# Altium schematic symbol library jlcpcb_2025_04_capacitors_extended_0805.schlib: 3281 symbols (part 18 of 18)
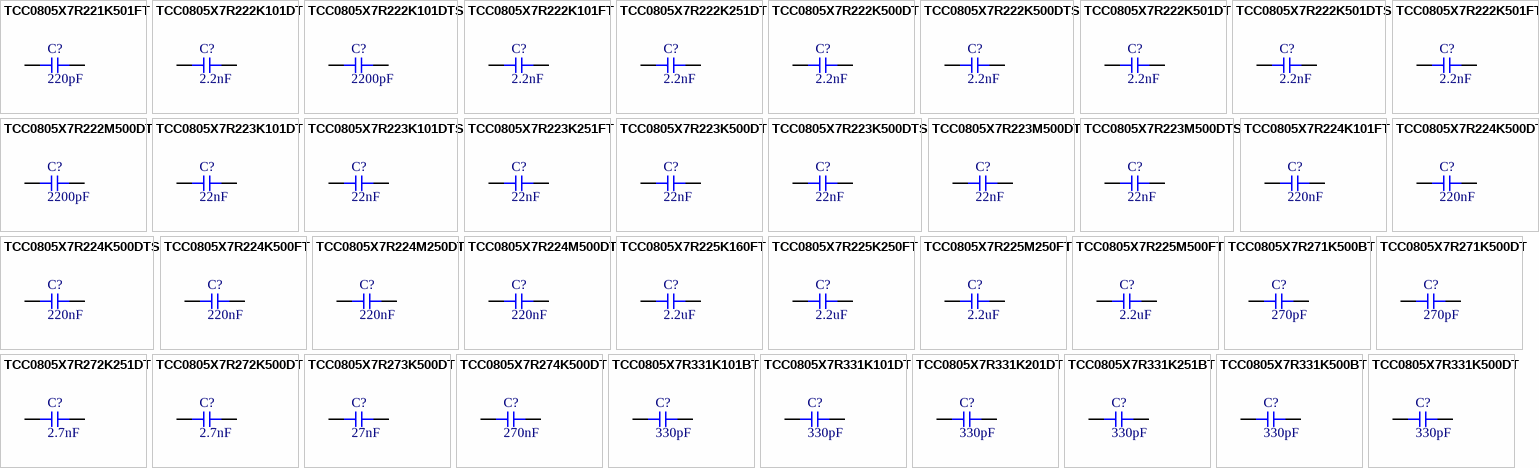
[diagram p99: symbols TCC0805X7R221K501FT to TCC0805X7R331K500DT]

## TCC0805X7R222K500DT
designator C?  Capacitance: 2.2nF  (hidden comment: *)
Capacitor, Ceramic (MLCC), 2.2nF, ±10%, 50V, X7R, ±10%, SMD 0805; Manufacturer: CCTC; Manufacturer Part Number: TCC0805X7R222K500DT; Package Size: 0805; JLCPCB Basic Part: No; JLCPCB Part Number: C376953; Supplier 1: LCSC; Category: Capacitors - MLCC; Supplier Part Number 1: C376953; Tolerance: ±10%; Voltage Rating: 50V; Temperature Coefficient: X7R; RoHS: Yes; ComponentLink1Description: Datasheet; ComponentLink1URL: https://wmsc.lcsc.com/wmsc/upload/file/pdf/v2/lcsc/2304140030_CCTC-TCC0805X7R222K500DT_C376953.pdf; ComponentLink2Description: JLCPCB Part URL; ComponentLink2URL: https://jlcpcb.com/partdetail/C376953; ComponentLink3Description: LCSC Part URL; ComponentLink3URL: https://lcsc.com/product-detail/Multilayer-Ceramic-Capacitors-MLCC---SMD-SMT_CCTC-CCTC-TCC0805X7R222K500DT_C376953.html
footprint CAP-0805 (0805 (2012M) Capacitor)
pins: 1, 2

## TCC0805X7R222K500DTS
designator C?  Capacitance: 2.2nF  (hidden comment: *)
Capacitor, Ceramic (MLCC), 2.2nF, ±10%, 50V, X7R, ±10%, SMD 0805; Manufacturer: CCTC; Manufacturer Part Number: TCC0805X7R222K500DTS; Package Size: 0805; JLCPCB Basic Part: No; JLCPCB Part Number: C376954; Supplier 1: LCSC; Category: Capacitors - MLCC; Supplier Part Number 1: C376954; Tolerance: ±10%; Voltage Rating: 50V; Temperature Coefficient: X7R; RoHS: Yes; ComponentLink1Description: Datasheet; ComponentLink1URL: https://wmsc.lcsc.com/wmsc/upload/file/pdf/v2/lcsc/2304140030_CCTC-TCC0805X7R222K500DTS_C376954.pdf; ComponentLink2Description: JLCPCB Part URL; ComponentLink2URL: https://jlcpcb.com/partdetail/C376954; ComponentLink3Description: LCSC Part URL; ComponentLink3URL: https://lcsc.com/product-detail/Multilayer-Ceramic-Capacitors-MLCC---SMD-SMT_CCTC-CCTC-TCC0805X7R222K500DTS_C376954.html
footprint CAP-0805 (0805 (2012M) Capacitor)
pins: 1, 2

## TCC0805X7R222K501DT
designator C?  Capacitance: 2.2nF  (hidden comment: *)
Capacitor, Ceramic (MLCC), 2.2nF, ±10%, 500V, X7R, ±10%, SMD 0805; Manufacturer: CCTC; Manufacturer Part Number: TCC0805X7R222K501DT; Package Size: 0805; JLCPCB Basic Part: No; JLCPCB Part Number: C376955; Supplier 1: LCSC; Category: Capacitors - MLCC; Supplier Part Number 1: C376955; Tolerance: ±10%; Voltage Rating: 500V; Temperature Coefficient: X7R; RoHS: Yes; ComponentLink1Description: Datasheet; ComponentLink1URL: https://wmsc.lcsc.com/wmsc/upload/file/pdf/v2/lcsc/2304140030_CCTC-TCC0805X7R222K501DT_C376955.pdf; ComponentLink2Description: JLCPCB Part URL; ComponentLink2URL: https://jlcpcb.com/partdetail/C376955; ComponentLink3Description: LCSC Part URL; ComponentLink3URL: https://lcsc.com/product-detail/Multilayer-Ceramic-Capacitors-MLCC---SMD-SMT_CCTC-CCTC-TCC0805X7R222K501DT_C376955.html
footprint CAP-0805 (0805 (2012M) Capacitor)
pins: 1, 2

## TCC0805X7R222K501DTS
designator C?  Capacitance: 2.2nF  (hidden comment: *)
Capacitor, Ceramic (MLCC), 2.2nF, ±10%, 500V, X7R, ±10%, SMD 0805; Manufacturer: CCTC; Manufacturer Part Number: TCC0805X7R222K501DTS; Package Size: 0805; JLCPCB Basic Part: No; JLCPCB Part Number: C696850; Supplier 1: LCSC; Category: Capacitors - MLCC; Supplier Part Number 1: C696850; Tolerance: ±10%; Voltage Rating: 500V; Temperature Coefficient: X7R; RoHS: Yes; ComponentLink1Description: Datasheet; ComponentLink1URL: https://wmsc.lcsc.com/wmsc/upload/file/pdf/v2/lcsc/2304140030_CCTC-TCC0805X7R222K501DTS_C696850.pdf; ComponentLink2Description: JLCPCB Part URL; ComponentLink2URL: https://jlcpcb.com/partdetail/C696850; ComponentLink3Description: LCSC Part URL; ComponentLink3URL: https://lcsc.com/product-detail/Multilayer-Ceramic-Capacitors-MLCC---SMD-SMT_CCTC-CCTC-TCC0805X7R222K501DTS_C696850.html
footprint CAP-0805 (0805 (2012M) Capacitor)
pins: 1, 2

## TCC0805X7R222K501FT
designator C?  Capacitance: 2.2nF  (hidden comment: *)
Capacitor, Ceramic (MLCC), 2.2nF, ±10%, 500V, X7R, ±10%, SMD 0805; Manufacturer: CCTC; Manufacturer Part Number: TCC0805X7R222K501FT; Package Size: 0805; JLCPCB Basic Part: No; JLCPCB Part Number: C376956; Supplier 1: LCSC; Category: Capacitors - MLCC; Supplier Part Number 1: C376956; Tolerance: ±10%; Voltage Rating: 500V; Temperature Coefficient: X7R; RoHS: Yes; ComponentLink1Description: Datasheet; ComponentLink1URL: https://wmsc.lcsc.com/wmsc/upload/file/pdf/v2/lcsc/2304140030_CCTC-TCC0805X7R222K501FT_C376956.pdf; ComponentLink2Description: JLCPCB Part URL; ComponentLink2URL: https://jlcpcb.com/partdetail/C376956; ComponentLink3Description: LCSC Part URL; ComponentLink3URL: https://lcsc.com/product-detail/Multilayer-Ceramic-Capacitors-MLCC---SMD-SMT_CCTC-CCTC-TCC0805X7R222K501FT_C376956.html
footprint CAP-0805 (0805 (2012M) Capacitor)
pins: 1, 2

## TCC0805X7R222M500DT
designator C?  Capacitance: 2200pF  (hidden comment: *)
Capacitor, Ceramic (MLCC), 2200pF, ±20%, 50V, X7R, ±20%, SMD 0805; Manufacturer: CCTC; Manufacturer Part Number: TCC0805X7R222M500DT; Package Size: 0805; JLCPCB Basic Part: No; JLCPCB Part Number: C915856; Supplier 1: LCSC; Category: Capacitors - MLCC; Supplier Part Number 1: C915856; Tolerance: ±20%; Voltage Rating: 50V; Temperature Coefficient: X7R; RoHS: Yes; ComponentLink1Description: Datasheet; ComponentLink1URL: https://wmsc.lcsc.com/wmsc/upload/file/pdf/v2/lcsc/2304140030_CCTC-TCC0805X7R222M500DT_C915856.pdf; ComponentLink2Description: JLCPCB Part URL; ComponentLink2URL: https://jlcpcb.com/partdetail/C915856; ComponentLink3Description: LCSC Part URL; ComponentLink3URL: https://lcsc.com/product-detail/Multilayer-Ceramic-Capacitors-MLCC---SMD-SMT_CCTC-CCTC-TCC0805X7R222M500DT_C915856.html
footprint CAP-0805 (0805 (2012M) Capacitor)
pins: 1, 2

## TCC0805X7R223K101DT
designator C?  Capacitance: 22nF  (hidden comment: *)
Capacitor, Ceramic (MLCC), 22nF, ±10%, 100V, X7R, ±10%, SMD 0805; Manufacturer: CCTC; Manufacturer Part Number: TCC0805X7R223K101DT; Package Size: 0805; JLCPCB Basic Part: No; JLCPCB Part Number: C282749; Supplier 1: LCSC; Category: Capacitors - MLCC; Supplier Part Number 1: C282749; Tolerance: ±10%; Voltage Rating: 100V; Temperature Coefficient: X7R; RoHS: Yes; ComponentLink1Description: Datasheet; ComponentLink1URL: https://wmsc.lcsc.com/wmsc/upload/file/pdf/v2/lcsc/2304140030_CCTC-TCC0805X7R223K101DT_C282749.pdf; ComponentLink2Description: JLCPCB Part URL; ComponentLink2URL: https://jlcpcb.com/partdetail/C282749; ComponentLink3Description: LCSC Part URL; ComponentLink3URL: https://lcsc.com/product-detail/Multilayer-Ceramic-Capacitors-MLCC---SMD-SMT_CCTC-CCTC-TCC0805X7R223K101DT_C282749.html
footprint CAP-0805 (0805 (2012M) Capacitor)
pins: 1, 2

## TCC0805X7R223K101DTS
designator C?  Capacitance: 22nF  (hidden comment: *)
Capacitor, Ceramic (MLCC), 22nF, ±10%, 100V, X7R, ±10%, SMD 0805; Manufacturer: CCTC; Manufacturer Part Number: TCC0805X7R223K101DTS; Package Size: 0805; JLCPCB Basic Part: No; JLCPCB Part Number: C696903; Supplier 1: LCSC; Category: Capacitors - MLCC; Supplier Part Number 1: C696903; Tolerance: ±10%; Voltage Rating: 100V; Temperature Coefficient: X7R; RoHS: Yes; ComponentLink1Description: Datasheet; ComponentLink1URL: https://wmsc.lcsc.com/wmsc/upload/file/pdf/v2/lcsc/2007071712_CCTC-TCC0805X7R223K101DTS_C696903.pdf; ComponentLink2Description: JLCPCB Part URL; ComponentLink2URL: https://jlcpcb.com/partdetail/C696903; ComponentLink3Description: LCSC Part URL; ComponentLink3URL: https://lcsc.com/product-detail/Multilayer-Ceramic-Capacitors-MLCC---SMD-SMT_CCTC-CCTC-TCC0805X7R223K101DTS_C696903.html
footprint CAP-0805 (0805 (2012M) Capacitor)
pins: 1, 2

## TCC0805X7R223K251FT
designator C?  Capacitance: 22nF  (hidden comment: *)
Capacitor, Ceramic (MLCC), 22nF, ±10%, 250V, X7R, ±10%, SMD 0805; Manufacturer: CCTC; Manufacturer Part Number: TCC0805X7R223K251FT; Package Size: 0805; JLCPCB Basic Part: No; JLCPCB Part Number: C282751; Supplier 1: LCSC; Category: Capacitors - MLCC; Supplier Part Number 1: C282751; Tolerance: ±10%; Voltage Rating: 250V; Temperature Coefficient: X7R; RoHS: Yes; ComponentLink1Description: Datasheet; ComponentLink1URL: https://wmsc.lcsc.com/wmsc/upload/file/pdf/v2/lcsc/2304140030_CCTC-TCC0805X7R223K251FT_C282751.pdf; ComponentLink2Description: JLCPCB Part URL; ComponentLink2URL: https://jlcpcb.com/partdetail/C282751; ComponentLink3Description: LCSC Part URL; ComponentLink3URL: https://lcsc.com/product-detail/Multilayer-Ceramic-Capacitors-MLCC---SMD-SMT_CCTC-CCTC-TCC0805X7R223K251FT_C282751.html
footprint CAP-0805 (0805 (2012M) Capacitor)
pins: 1, 2

## TCC0805X7R223K500DT
designator C?  Capacitance: 22nF  (hidden comment: *)
Capacitor, Ceramic (MLCC), 22nF, ±10%, 50V, X7R, ±10%, SMD 0805; Manufacturer: CCTC; Manufacturer Part Number: TCC0805X7R223K500DT; Package Size: 0805; JLCPCB Basic Part: No; JLCPCB Part Number: C282752; Supplier 1: LCSC; Category: Capacitors - MLCC; Supplier Part Number 1: C282752; Tolerance: ±10%; Voltage Rating: 50V; Temperature Coefficient: X7R; RoHS: Yes; ComponentLink1Description: Datasheet; ComponentLink1URL: https://wmsc.lcsc.com/wmsc/upload/file/pdf/v2/lcsc/2304140030_CCTC-TCC0805X7R223K500DT_C282752.pdf; ComponentLink2Description: JLCPCB Part URL; ComponentLink2URL: https://jlcpcb.com/partdetail/C282752; ComponentLink3Description: LCSC Part URL; ComponentLink3URL: https://lcsc.com/product-detail/Multilayer-Ceramic-Capacitors-MLCC---SMD-SMT_CCTC-CCTC-TCC0805X7R223K500DT_C282752.html
footprint CAP-0805 (0805 (2012M) Capacitor)
pins: 1, 2

## TCC0805X7R223K500DTS
designator C?  Capacitance: 22nF  (hidden comment: *)
Capacitor, Ceramic (MLCC), 22nF, ±10%, 50V, X7R, ±10%, SMD 0805; Manufacturer: CCTC; Manufacturer Part Number: TCC0805X7R223K500DTS; Package Size: 0805; JLCPCB Basic Part: No; JLCPCB Part Number: C376957; Supplier 1: LCSC; Category: Capacitors - MLCC; Supplier Part Number 1: C376957; Tolerance: ±10%; Voltage Rating: 50V; Temperature Coefficient: X7R; RoHS: Yes; ComponentLink1Description: Datasheet; ComponentLink1URL: https://wmsc.lcsc.com/wmsc/upload/file/pdf/v2/lcsc/2304140030_CCTC-TCC0805X7R223K500DTS_C376957.pdf; ComponentLink2Description: JLCPCB Part URL; ComponentLink2URL: https://jlcpcb.com/partdetail/C376957; ComponentLink3Description: LCSC Part URL; ComponentLink3URL: https://lcsc.com/product-detail/Multilayer-Ceramic-Capacitors-MLCC---SMD-SMT_CCTC-CCTC-TCC0805X7R223K500DTS_C376957.html
footprint CAP-0805 (0805 (2012M) Capacitor)
pins: 1, 2

## TCC0805X7R223M500DT
designator C?  Capacitance: 22nF  (hidden comment: *)
Capacitor, Ceramic (MLCC), 22nF, ±20%, 50V, X7R, ±20%, SMD 0805; Manufacturer: CCTC; Manufacturer Part Number: TCC0805X7R223M500DT; Package Size: 0805; JLCPCB Basic Part: No; JLCPCB Part Number: C376958; Supplier 1: LCSC; Category: Capacitors - MLCC; Supplier Part Number 1: C376958; Tolerance: ±20%; Voltage Rating: 50V; Temperature Coefficient: X7R; RoHS: Yes; ComponentLink1Description: Datasheet; ComponentLink1URL: https://wmsc.lcsc.com/wmsc/upload/file/pdf/v2/lcsc/2304140030_CCTC-TCC0805X7R223M500DT_C376958.pdf; ComponentLink2Description: JLCPCB Part URL; ComponentLink2URL: https://jlcpcb.com/partdetail/C376958; ComponentLink3Description: LCSC Part URL; ComponentLink3URL: https://lcsc.com/product-detail/Multilayer-Ceramic-Capacitors-MLCC---SMD-SMT_CCTC-CCTC-TCC0805X7R223M500DT_C376958.html
footprint CAP-0805 (0805 (2012M) Capacitor)
pins: 1, 2

## TCC0805X7R223M500DTS
designator C?  Capacitance: 22nF  (hidden comment: *)
Capacitor, Ceramic (MLCC), 22nF, ±20%, 50V, X7R, ±20%, SMD 0805; Manufacturer: CCTC; Manufacturer Part Number: TCC0805X7R223M500DTS; Package Size: 0805; JLCPCB Basic Part: No; JLCPCB Part Number: C376959; Supplier 1: LCSC; Category: Capacitors - MLCC; Supplier Part Number 1: C376959; Tolerance: ±20%; Voltage Rating: 50V; Temperature Coefficient: X7R; RoHS: Yes; ComponentLink1Description: Datasheet; ComponentLink1URL: https://wmsc.lcsc.com/wmsc/upload/file/pdf/v2/lcsc/2304140030_CCTC-TCC0805X7R223M500DTS_C376959.pdf; ComponentLink2Description: JLCPCB Part URL; ComponentLink2URL: https://jlcpcb.com/partdetail/C376959; ComponentLink3Description: LCSC Part URL; ComponentLink3URL: https://lcsc.com/product-detail/Multilayer-Ceramic-Capacitors-MLCC---SMD-SMT_CCTC-CCTC-TCC0805X7R223M500DTS_C376959.html
footprint CAP-0805 (0805 (2012M) Capacitor)
pins: 1, 2

## TCC0805X7R224K101FT
designator C?  Capacitance: 220nF  (hidden comment: *)
Capacitor, Ceramic (MLCC), 220nF, ±10%, 100V, X7R, ±10%, SMD 0805; Manufacturer: CCTC; Manufacturer Part Number: TCC0805X7R224K101FT; Package Size: 0805; JLCPCB Basic Part: No; JLCPCB Part Number: C2994652; Supplier 1: LCSC; Category: Capacitors - MLCC; Supplier Part Number 1: C2994652; Tolerance: ±10%; Voltage Rating: 100V; Temperature Coefficient: X7R; RoHS: Yes; ComponentLink1Description: Datasheet; ComponentLink1URL: https://wmsc.lcsc.com/wmsc/upload/file/pdf/v2/lcsc/2204121745_CCTC-TCC0805X7R224K101FT_C2994652.pdf; ComponentLink2Description: JLCPCB Part URL; ComponentLink2URL: https://jlcpcb.com/partdetail/C2994652; ComponentLink3Description: LCSC Part URL; ComponentLink3URL: https://lcsc.com/product-detail/Multilayer-Ceramic-Capacitors-MLCC---SMD-SMT_CCTC-CCTC-TCC0805X7R224K101FT_C2994652.html
footprint CAP-0805 (0805 (2012M) Capacitor)
pins: 1, 2

## TCC0805X7R224K500DT
designator C?  Capacitance: 220nF  (hidden comment: *)
Capacitor, Ceramic (MLCC), 220nF, ±10%, 50V, X7R, ±10%, SMD 0805; Manufacturer: CCTC; Manufacturer Part Number: TCC0805X7R224K500DT; Package Size: 0805; JLCPCB Basic Part: No; JLCPCB Part Number: C282753; Supplier 1: LCSC; Category: Capacitors - MLCC; Supplier Part Number 1: C282753; Tolerance: ±10%; Voltage Rating: 50V; Temperature Coefficient: X7R; RoHS: Yes; ComponentLink1Description: Datasheet; ComponentLink1URL: https://wmsc.lcsc.com/wmsc/upload/file/pdf/v2/lcsc/2304140030_CCTC-TCC0805X7R224K500DT_C282753.pdf; ComponentLink2Description: JLCPCB Part URL; ComponentLink2URL: https://jlcpcb.com/partdetail/C282753; ComponentLink3Description: LCSC Part URL; ComponentLink3URL: https://lcsc.com/product-detail/Multilayer-Ceramic-Capacitors-MLCC---SMD-SMT_CCTC-CCTC-TCC0805X7R224K500DT_C282753.html
footprint CAP-0805 (0805 (2012M) Capacitor)
pins: 1, 2

## TCC0805X7R224K500DTS
designator C?  Capacitance: 220nF  (hidden comment: *)
Capacitor, Ceramic (MLCC), 220nF, ±10%, 50V, X7R, ±10%, SMD 0805; Manufacturer: CCTC; Manufacturer Part Number: TCC0805X7R224K500DTS; Package Size: 0805; JLCPCB Basic Part: No; JLCPCB Part Number: C376960; Supplier 1: LCSC; Category: Capacitors - MLCC; Supplier Part Number 1: C376960; Tolerance: ±10%; Voltage Rating: 50V; Temperature Coefficient: X7R; RoHS: Yes; ComponentLink1Description: Datasheet; ComponentLink1URL: https://wmsc.lcsc.com/wmsc/upload/file/pdf/v2/lcsc/2304140030_CCTC-TCC0805X7R224K500DTS_C376960.pdf; ComponentLink2Description: JLCPCB Part URL; ComponentLink2URL: https://jlcpcb.com/partdetail/C376960; ComponentLink3Description: LCSC Part URL; ComponentLink3URL: https://lcsc.com/product-detail/Multilayer-Ceramic-Capacitors-MLCC---SMD-SMT_CCTC-CCTC-TCC0805X7R224K500DTS_C376960.html
footprint CAP-0805 (0805 (2012M) Capacitor)
pins: 1, 2

## TCC0805X7R224K500FT
designator C?  Capacitance: 220nF  (hidden comment: *)
Capacitor, Ceramic (MLCC), 220nF, ±10%, 50V, X7R, ±10%, SMD 0805; Manufacturer: CCTC; Manufacturer Part Number: TCC0805X7R224K500FT; Package Size: 0805; JLCPCB Basic Part: No; JLCPCB Part Number: C376961; Supplier 1: LCSC; Category: Capacitors - MLCC; Supplier Part Number 1: C376961; Tolerance: ±10%; Voltage Rating: 50V; Temperature Coefficient: X7R; RoHS: Yes; ComponentLink1Description: Datasheet; ComponentLink1URL: https://wmsc.lcsc.com/wmsc/upload/file/pdf/v2/lcsc/2304140030_CCTC-TCC0805X7R224K500FT_C376961.pdf; ComponentLink2Description: JLCPCB Part URL; ComponentLink2URL: https://jlcpcb.com/partdetail/C376961; ComponentLink3Description: LCSC Part URL; ComponentLink3URL: https://lcsc.com/product-detail/Multilayer-Ceramic-Capacitors-MLCC---SMD-SMT_CCTC-CCTC-TCC0805X7R224K500FT_C376961.html
footprint CAP-0805 (0805 (2012M) Capacitor)
pins: 1, 2

## TCC0805X7R224M250DT
designator C?  Capacitance: 220nF  (hidden comment: *)
Capacitor, Ceramic (MLCC), 220nF, ±20%, 25V, X7R, ±20%, SMD 0805; Manufacturer: CCTC; Manufacturer Part Number: TCC0805X7R224M250DT; Package Size: 0805; JLCPCB Basic Part: No; JLCPCB Part Number: C376962; Supplier 1: LCSC; Category: Capacitors - MLCC; Supplier Part Number 1: C376962; Tolerance: ±20%; Voltage Rating: 25V; Temperature Coefficient: X7R; RoHS: Yes; ComponentLink1Description: Datasheet; ComponentLink1URL: https://wmsc.lcsc.com/wmsc/upload/file/pdf/v2/lcsc/2304140030_CCTC-TCC0805X7R224M250DT_C376962.pdf; ComponentLink2Description: JLCPCB Part URL; ComponentLink2URL: https://jlcpcb.com/partdetail/C376962; ComponentLink3Description: LCSC Part URL; ComponentLink3URL: https://lcsc.com/product-detail/Multilayer-Ceramic-Capacitors-MLCC---SMD-SMT_CCTC-CCTC-TCC0805X7R224M250DT_C376962.html
footprint CAP-0805 (0805 (2012M) Capacitor)
pins: 1, 2

## TCC0805X7R224M500DT
designator C?  Capacitance: 220nF  (hidden comment: *)
Capacitor, Ceramic (MLCC), 220nF, ±20%, 50V, X7R, ±20%, SMD 0805; Manufacturer: CCTC; Manufacturer Part Number: TCC0805X7R224M500DT; Package Size: 0805; JLCPCB Basic Part: No; JLCPCB Part Number: C2760544; Supplier 1: LCSC; Category: Capacitors - MLCC; Supplier Part Number 1: C2760544; Tolerance: ±20%; Voltage Rating: 50V; Temperature Coefficient: X7R; RoHS: Yes; ComponentLink1Description: Datasheet; ComponentLink1URL: https://wmsc.lcsc.com/wmsc/upload/file/pdf/v2/lcsc/2304140030_CCTC-TCC0805X7R224M500DT_C2760544.pdf; ComponentLink2Description: JLCPCB Part URL; ComponentLink2URL: https://jlcpcb.com/partdetail/C2760544; ComponentLink3Description: LCSC Part URL; ComponentLink3URL: https://lcsc.com/product-detail/Multilayer-Ceramic-Capacitors-MLCC---SMD-SMT_CCTC-CCTC-TCC0805X7R224M500DT_C2760544.html
footprint CAP-0805 (0805 (2012M) Capacitor)
pins: 1, 2

## TCC0805X7R225K160FT
designator C?  Capacitance: 2.2uF  (hidden comment: *)
Capacitor, Ceramic (MLCC), 2.2uF, ±10%, 16V, X7R, ±10%, SMD 0805; Manufacturer: CCTC; Manufacturer Part Number: TCC0805X7R225K160FT; Package Size: 0805; JLCPCB Basic Part: No; JLCPCB Part Number: C380348; Supplier 1: LCSC; Category: Capacitors - MLCC; Supplier Part Number 1: C380348; Tolerance: ±10%; Voltage Rating: 16V; Temperature Coefficient: X7R; RoHS: Yes; ComponentLink1Description: Datasheet; ComponentLink1URL: https://wmsc.lcsc.com/wmsc/upload/file/pdf/v2/lcsc/2304140030_CCTC-TCC0805X7R225K160FT_C380348.pdf; ComponentLink2Description: JLCPCB Part URL; ComponentLink2URL: https://jlcpcb.com/partdetail/C380348; ComponentLink3Description: LCSC Part URL; ComponentLink3URL: https://lcsc.com/product-detail/Multilayer-Ceramic-Capacitors-MLCC---SMD-SMT_CCTC-CCTC-TCC0805X7R225K160FT_C380348.html
footprint CAP-0805 (0805 (2012M) Capacitor)
pins: 1, 2

## TCC0805X7R225K250FT
designator C?  Capacitance: 2.2uF  (hidden comment: *)
Capacitor, Ceramic (MLCC), 2.2uF, ±10%, 25V, X7R, ±10%, SMD 0805; Manufacturer: CCTC; Manufacturer Part Number: TCC0805X7R225K250FT; Package Size: 0805; JLCPCB Basic Part: No; JLCPCB Part Number: C380349; Supplier 1: LCSC; Category: Capacitors - MLCC; Supplier Part Number 1: C380349; Tolerance: ±10%; Voltage Rating: 25V; Temperature Coefficient: X7R; RoHS: Yes; ComponentLink1Description: Datasheet; ComponentLink1URL: https://wmsc.lcsc.com/wmsc/upload/file/pdf/v2/lcsc/2304140030_CCTC-TCC0805X7R225K250FT_C380349.pdf; ComponentLink2Description: JLCPCB Part URL; ComponentLink2URL: https://jlcpcb.com/partdetail/C380349; ComponentLink3Description: LCSC Part URL; ComponentLink3URL: https://lcsc.com/product-detail/Multilayer-Ceramic-Capacitors-MLCC---SMD-SMT_CCTC-CCTC-TCC0805X7R225K250FT_C380349.html
footprint CAP-0805 (0805 (2012M) Capacitor)
pins: 1, 2

## TCC0805X7R225M250FT
designator C?  Capacitance: 2.2uF  (hidden comment: *)
Capacitor, Ceramic (MLCC), 2.2uF, ±20%, 25V, X7R, ±20%, SMD 0805; Manufacturer: CCTC; Manufacturer Part Number: TCC0805X7R225M250FT; Package Size: 0805; JLCPCB Basic Part: No; JLCPCB Part Number: C5448893; Supplier 1: LCSC; Category: Capacitors - MLCC; Supplier Part Number 1: C5448893; Tolerance: ±20%; Voltage Rating: 25V; Temperature Coefficient: X7R; RoHS: Yes; ComponentLink1Description: Datasheet; ComponentLink2Description: JLCPCB Part URL; ComponentLink2URL: https://jlcpcb.com/partdetail/C5448893; ComponentLink3Description: LCSC Part URL; ComponentLink3URL: https://lcsc.com/product-detail/Multilayer-Ceramic-Capacitors-MLCC---SMD-SMT_CCTC-CCTC-TCC0805X7R225M250FT_C5448893.html
footprint CAP-0805 (0805 (2012M) Capacitor)
pins: 1, 2

## TCC0805X7R225M500FT
designator C?  Capacitance: 2.2uF  (hidden comment: *)
Capacitor, Ceramic (MLCC), 2.2uF, ±20%, null, X7R, ±20%, SMD 0805; Manufacturer: CCTC; Manufacturer Part Number: TCC0805X7R225M500FT; Package Size: 0805; JLCPCB Basic Part: No; JLCPCB Part Number: C7393943; Supplier 1: LCSC; Category: Capacitors - MLCC; Supplier Part Number 1: C7393943; Tolerance: ±20%; Voltage Rating: null; Temperature Coefficient: X7R; RoHS: Yes; ComponentLink1Description: Datasheet; ComponentLink1URL: https://wmsc.lcsc.com/wmsc/upload/file/pdf/v2/lcsc/2306211555_CCTC-TCC0805X7R225M500FT_C7393943.pdf; ComponentLink2Description: JLCPCB Part URL; ComponentLink2URL: https://jlcpcb.com/partdetail/C7393943; ComponentLink3Description: LCSC Part URL; ComponentLink3URL: https://lcsc.com/product-detail/Multilayer-Ceramic-Capacitors-MLCC---SMD-SMT_CCTC-CCTC-TCC0805X7R225M500FT_C7393943.html
footprint CAP-0805 (0805 (2012M) Capacitor)
pins: 1, 2

## TCC0805X7R271K500BT
designator C?  Capacitance: 270pF  (hidden comment: *)
Capacitor, Ceramic (MLCC), 270pF, ±10%, 50V, X7R, ±10%, SMD 0805; Manufacturer: CCTC; Manufacturer Part Number: TCC0805X7R271K500BT; Package Size: 0805; JLCPCB Basic Part: No; JLCPCB Part Number: C376964; Supplier 1: LCSC; Category: Capacitors - MLCC; Supplier Part Number 1: C376964; Tolerance: ±10%; Voltage Rating: 50V; Temperature Coefficient: X7R; RoHS: Yes; ComponentLink1Description: Datasheet; ComponentLink1URL: https://wmsc.lcsc.com/wmsc/upload/file/pdf/v2/lcsc/2304140030_CCTC-TCC0805X7R271K500BT_C376964.pdf; ComponentLink2Description: JLCPCB Part URL; ComponentLink2URL: https://jlcpcb.com/partdetail/C376964; ComponentLink3Description: LCSC Part URL; ComponentLink3URL: https://lcsc.com/product-detail/Multilayer-Ceramic-Capacitors-MLCC---SMD-SMT_CCTC-CCTC-TCC0805X7R271K500BT_C376964.html
footprint CAP-0805 (0805 (2012M) Capacitor)
pins: 1, 2

## TCC0805X7R271K500DT
designator C?  Capacitance: 270pF  (hidden comment: *)
Capacitor, Ceramic (MLCC), 270pF, ±10%, 50V, X7R, ±10%, SMD 0805; Manufacturer: CCTC; Manufacturer Part Number: TCC0805X7R271K500DT; Package Size: 0805; JLCPCB Basic Part: No; JLCPCB Part Number: C376965; Supplier 1: LCSC; Category: Capacitors - MLCC; Supplier Part Number 1: C376965; Tolerance: ±10%; Voltage Rating: 50V; Temperature Coefficient: X7R; RoHS: Yes; ComponentLink1Description: Datasheet; ComponentLink1URL: https://wmsc.lcsc.com/wmsc/upload/file/pdf/v2/lcsc/2304140030_CCTC-TCC0805X7R271K500DT_C376965.pdf; ComponentLink2Description: JLCPCB Part URL; ComponentLink2URL: https://jlcpcb.com/partdetail/C376965; ComponentLink3Description: LCSC Part URL; ComponentLink3URL: https://lcsc.com/product-detail/Multilayer-Ceramic-Capacitors-MLCC---SMD-SMT_CCTC-CCTC-TCC0805X7R271K500DT_C376965.html
footprint CAP-0805 (0805 (2012M) Capacitor)
pins: 1, 2

## TCC0805X7R272K251DT
designator C?  Capacitance: 2.7nF  (hidden comment: *)
Capacitor, Ceramic (MLCC), 2.7nF, ±10%, 250V, X7R, ±10%, SMD 0805; Manufacturer: CCTC; Manufacturer Part Number: TCC0805X7R272K251DT; Package Size: 0805; JLCPCB Basic Part: No; JLCPCB Part Number: C5375887; Supplier 1: LCSC; Category: Capacitors - MLCC; Supplier Part Number 1: C5375887; Tolerance: ±10%; Voltage Rating: 250V; Temperature Coefficient: X7R; RoHS: Yes; ComponentLink1Description: Datasheet; ComponentLink1URL: https://wmsc.lcsc.com/wmsc/upload/file/pdf/v2/lcsc/2403281709_CCTC-TCC0805X7R272K251DT_C5375887.pdf; ComponentLink2Description: JLCPCB Part URL; ComponentLink2URL: https://jlcpcb.com/partdetail/C5375887; ComponentLink3Description: LCSC Part URL; ComponentLink3URL: https://lcsc.com/product-detail/Multilayer-Ceramic-Capacitors-MLCC---SMD-SMT_CCTC-CCTC-TCC0805X7R272K251DT_C5375887.html
footprint CAP-0805 (0805 (2012M) Capacitor)
pins: 1, 2

## TCC0805X7R272K500DT
designator C?  Capacitance: 2.7nF  (hidden comment: *)
Capacitor, Ceramic (MLCC), 2.7nF, ±10%, 50V, X7R, ±10%, SMD 0805; Manufacturer: CCTC; Manufacturer Part Number: TCC0805X7R272K500DT; Package Size: 0805; JLCPCB Basic Part: No; JLCPCB Part Number: C376966; Supplier 1: LCSC; Category: Capacitors - MLCC; Supplier Part Number 1: C376966; Tolerance: ±10%; Voltage Rating: 50V; Temperature Coefficient: X7R; RoHS: Yes; ComponentLink1Description: Datasheet; ComponentLink1URL: https://wmsc.lcsc.com/wmsc/upload/file/pdf/v2/lcsc/2304140030_CCTC-TCC0805X7R272K500DT_C376966.pdf; ComponentLink2Description: JLCPCB Part URL; ComponentLink2URL: https://jlcpcb.com/partdetail/C376966; ComponentLink3Description: LCSC Part URL; ComponentLink3URL: https://lcsc.com/product-detail/Multilayer-Ceramic-Capacitors-MLCC---SMD-SMT_CCTC-CCTC-TCC0805X7R272K500DT_C376966.html
footprint CAP-0805 (0805 (2012M) Capacitor)
pins: 1, 2

## TCC0805X7R273K500DT
designator C?  Capacitance: 27nF  (hidden comment: *)
Capacitor, Ceramic (MLCC), 27nF, ±10%, 50V, X7R, ±10%, SMD 0805; Manufacturer: CCTC; Manufacturer Part Number: TCC0805X7R273K500DT; Package Size: 0805; JLCPCB Basic Part: No; JLCPCB Part Number: C376967; Supplier 1: LCSC; Category: Capacitors - MLCC; Supplier Part Number 1: C376967; Tolerance: ±10%; Voltage Rating: 50V; Temperature Coefficient: X7R; RoHS: Yes; ComponentLink1Description: Datasheet; ComponentLink1URL: https://wmsc.lcsc.com/wmsc/upload/file/pdf/v2/lcsc/2304140030_CCTC-TCC0805X7R273K500DT_C376967.pdf; ComponentLink2Description: JLCPCB Part URL; ComponentLink2URL: https://jlcpcb.com/partdetail/C376967; ComponentLink3Description: LCSC Part URL; ComponentLink3URL: https://lcsc.com/product-detail/Multilayer-Ceramic-Capacitors-MLCC---SMD-SMT_CCTC-CCTC-TCC0805X7R273K500DT_C376967.html
footprint CAP-0805 (0805 (2012M) Capacitor)
pins: 1, 2

## TCC0805X7R274K500DT
designator C?  Capacitance: 270nF  (hidden comment: *)
Capacitor, Ceramic (MLCC), 270nF, ±10%, 50V, X7R, ±10%, SMD 0805; Manufacturer: CCTC; Manufacturer Part Number: TCC0805X7R274K500DT; Package Size: 0805; JLCPCB Basic Part: No; JLCPCB Part Number: C376968; Supplier 1: LCSC; Category: Capacitors - MLCC; Supplier Part Number 1: C376968; Tolerance: ±10%; Voltage Rating: 50V; Temperature Coefficient: X7R; RoHS: Yes; ComponentLink1Description: Datasheet; ComponentLink1URL: https://wmsc.lcsc.com/wmsc/upload/file/pdf/v2/lcsc/2304140030_CCTC-TCC0805X7R274K500DT_C376968.pdf; ComponentLink2Description: JLCPCB Part URL; ComponentLink2URL: https://jlcpcb.com/partdetail/C376968; ComponentLink3Description: LCSC Part URL; ComponentLink3URL: https://lcsc.com/product-detail/Multilayer-Ceramic-Capacitors-MLCC---SMD-SMT_CCTC-CCTC-TCC0805X7R274K500DT_C376968.html
footprint CAP-0805 (0805 (2012M) Capacitor)
pins: 1, 2

## TCC0805X7R331K101BT
designator C?  Capacitance: 330pF  (hidden comment: *)
Capacitor, Ceramic (MLCC), 330pF, ±10%, 100V, X7R, ±10%, SMD 0805; Manufacturer: CCTC; Manufacturer Part Number: TCC0805X7R331K101BT; Package Size: 0805; JLCPCB Basic Part: No; JLCPCB Part Number: C376971; Supplier 1: LCSC; Category: Capacitors - MLCC; Supplier Part Number 1: C376971; Tolerance: ±10%; Voltage Rating: 100V; Temperature Coefficient: X7R; RoHS: Yes; ComponentLink1Description: Datasheet; ComponentLink1URL: https://wmsc.lcsc.com/wmsc/upload/file/pdf/v2/lcsc/2304140030_CCTC-TCC0805X7R331K101BT_C376971.pdf; ComponentLink2Description: JLCPCB Part URL; ComponentLink2URL: https://jlcpcb.com/partdetail/C376971; ComponentLink3Description: LCSC Part URL; ComponentLink3URL: https://lcsc.com/product-detail/Multilayer-Ceramic-Capacitors-MLCC---SMD-SMT_CCTC-CCTC-TCC0805X7R331K101BT_C376971.html
footprint CAP-0805 (0805 (2012M) Capacitor)
pins: 1, 2

## TCC0805X7R331K101DT
designator C?  Capacitance: 330pF  (hidden comment: *)
Capacitor, Ceramic (MLCC), 330pF, ±10%, 100V, X7R, ±10%, SMD 0805; Manufacturer: CCTC; Manufacturer Part Number: TCC0805X7R331K101DT; Package Size: 0805; JLCPCB Basic Part: No; JLCPCB Part Number: C344181; Supplier 1: LCSC; Category: Capacitors - MLCC; Supplier Part Number 1: C344181; Tolerance: ±10%; Voltage Rating: 100V; Temperature Coefficient: X7R; RoHS: Yes; ComponentLink1Description: Datasheet; ComponentLink1URL: https://wmsc.lcsc.com/wmsc/upload/file/pdf/v2/lcsc/2304140030_CCTC-TCC0805X7R331K101DT_C344181.pdf; ComponentLink2Description: JLCPCB Part URL; ComponentLink2URL: https://jlcpcb.com/partdetail/C344181; ComponentLink3Description: LCSC Part URL; ComponentLink3URL: https://lcsc.com/product-detail/Multilayer-Ceramic-Capacitors-MLCC---SMD-SMT_CCTC-CCTC-TCC0805X7R331K101DT_C344181.html
footprint CAP-0805 (0805 (2012M) Capacitor)
pins: 1, 2

## TCC0805X7R331K201DT
designator C?  Capacitance: 330pF  (hidden comment: *)
Capacitor, Ceramic (MLCC), 330pF, ±10%, 200V, X7R, ±10%, SMD 0805; Manufacturer: CCTC; Manufacturer Part Number: TCC0805X7R331K201DT; Package Size: 0805; JLCPCB Basic Part: No; JLCPCB Part Number: C344182; Supplier 1: LCSC; Category: Capacitors - MLCC; Supplier Part Number 1: C344182; Tolerance: ±10%; Voltage Rating: 200V; Temperature Coefficient: X7R; RoHS: Yes; ComponentLink1Description: Datasheet; ComponentLink1URL: https://wmsc.lcsc.com/wmsc/upload/file/pdf/v2/lcsc/2304140030_CCTC-TCC0805X7R331K201DT_C344182.pdf; ComponentLink2Description: JLCPCB Part URL; ComponentLink2URL: https://jlcpcb.com/partdetail/C344182; ComponentLink3Description: LCSC Part URL; ComponentLink3URL: https://lcsc.com/product-detail/Multilayer-Ceramic-Capacitors-MLCC---SMD-SMT_CCTC-CCTC-TCC0805X7R331K201DT_C344182.html
footprint CAP-0805 (0805 (2012M) Capacitor)
pins: 1, 2

## TCC0805X7R331K251BT
designator C?  Capacitance: 330pF  (hidden comment: *)
Capacitor, Ceramic (MLCC), 330pF, ±10%, 250V, X7R, ±10%, SMD 0805; Manufacturer: CCTC; Manufacturer Part Number: TCC0805X7R331K251BT; Package Size: 0805; JLCPCB Basic Part: No; JLCPCB Part Number: C376972; Supplier 1: LCSC; Category: Capacitors - MLCC; Supplier Part Number 1: C376972; Tolerance: ±10%; Voltage Rating: 250V; Temperature Coefficient: X7R; RoHS: Yes; ComponentLink1Description: Datasheet; ComponentLink1URL: https://wmsc.lcsc.com/wmsc/upload/file/pdf/v2/lcsc/2304140030_CCTC-TCC0805X7R331K251BT_C376972.pdf; ComponentLink2Description: JLCPCB Part URL; ComponentLink2URL: https://jlcpcb.com/partdetail/C376972; ComponentLink3Description: LCSC Part URL; ComponentLink3URL: https://lcsc.com/product-detail/Multilayer-Ceramic-Capacitors-MLCC---SMD-SMT_CCTC-CCTC-TCC0805X7R331K251BT_C376972.html
footprint CAP-0805 (0805 (2012M) Capacitor)
pins: 1, 2

## TCC0805X7R331K500BT
designator C?  Capacitance: 330pF  (hidden comment: *)
Capacitor, Ceramic (MLCC), 330pF, ±10%, 50V, X7R, ±10%, SMD 0805; Manufacturer: CCTC; Manufacturer Part Number: TCC0805X7R331K500BT; Package Size: 0805; JLCPCB Basic Part: No; JLCPCB Part Number: C376973; Supplier 1: LCSC; Category: Capacitors - MLCC; Supplier Part Number 1: C376973; Tolerance: ±10%; Voltage Rating: 50V; Temperature Coefficient: X7R; RoHS: Yes; ComponentLink1Description: Datasheet; ComponentLink1URL: https://wmsc.lcsc.com/wmsc/upload/file/pdf/v2/lcsc/2304140030_CCTC-TCC0805X7R331K500BT_C376973.pdf; ComponentLink2Description: JLCPCB Part URL; ComponentLink2URL: https://jlcpcb.com/partdetail/C376973; ComponentLink3Description: LCSC Part URL; ComponentLink3URL: https://lcsc.com/product-detail/Multilayer-Ceramic-Capacitors-MLCC---SMD-SMT_CCTC-CCTC-TCC0805X7R331K500BT_C376973.html
footprint CAP-0805 (0805 (2012M) Capacitor)
pins: 1, 2

## TCC0805X7R331K500DT
designator C?  Capacitance: 330pF  (hidden comment: *)
Capacitor, Ceramic (MLCC), 330pF, ±10%, 50V, X7R, ±10%, SMD 0805; Manufacturer: CCTC; Manufacturer Part Number: TCC0805X7R331K500DT; Package Size: 0805; JLCPCB Basic Part: No; JLCPCB Part Number: C376974; Supplier 1: LCSC; Category: Capacitors - MLCC; Supplier Part Number 1: C376974; Tolerance: ±10%; Voltage Rating: 50V; Temperature Coefficient: X7R; RoHS: Yes; ComponentLink1Description: Datasheet; ComponentLink1URL: https://wmsc.lcsc.com/wmsc/upload/file/pdf/v2/lcsc/2304140030_CCTC-TCC0805X7R331K500DT_C376974.pdf; ComponentLink2Description: JLCPCB Part URL; ComponentLink2URL: https://jlcpcb.com/partdetail/C376974; ComponentLink3Description: LCSC Part URL; ComponentLink3URL: https://lcsc.com/product-detail/Multilayer-Ceramic-Capacitors-MLCC---SMD-SMT_CCTC-CCTC-TCC0805X7R331K500DT_C376974.html
footprint CAP-0805 (0805 (2012M) Capacitor)
pins: 1, 2

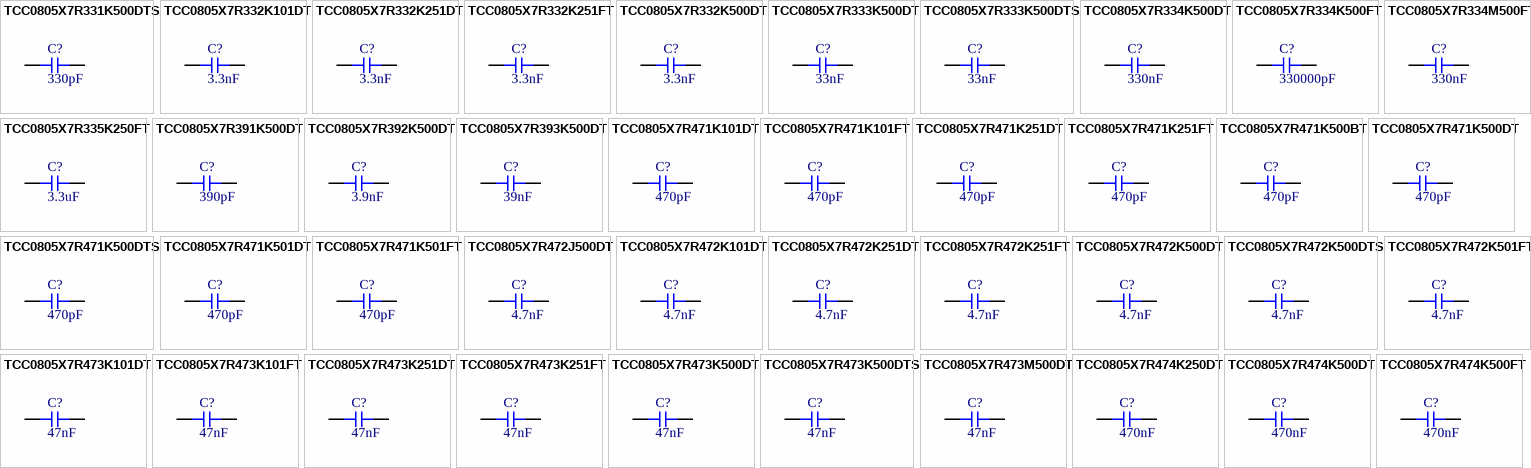
[diagram p79: symbols TCC0805X7R331K500DTS to TCC0805X7R474K500FT]

## TCC0805X7R331K500DTS
designator C?  Capacitance: 330pF  (hidden comment: *)
Capacitor, Ceramic (MLCC), 330pF, ±10%, 50V, X7R, ±10%, SMD 0805; Manufacturer: CCTC; Manufacturer Part Number: TCC0805X7R331K500DTS; Package Size: 0805; JLCPCB Basic Part: No; JLCPCB Part Number: C376975; Supplier 1: LCSC; Category: Capacitors - MLCC; Supplier Part Number 1: C376975; Tolerance: ±10%; Voltage Rating: 50V; Temperature Coefficient: X7R; RoHS: Yes; ComponentLink1Description: Datasheet; ComponentLink1URL: https://wmsc.lcsc.com/wmsc/upload/file/pdf/v2/lcsc/2304140030_CCTC-TCC0805X7R331K500DTS_C376975.pdf; ComponentLink2Description: JLCPCB Part URL; ComponentLink2URL: https://jlcpcb.com/partdetail/C376975; ComponentLink3Description: LCSC Part URL; ComponentLink3URL: https://lcsc.com/product-detail/Multilayer-Ceramic-Capacitors-MLCC---SMD-SMT_CCTC-CCTC-TCC0805X7R331K500DTS_C376975.html
footprint CAP-0805 (0805 (2012M) Capacitor)
pins: 1, 2

## TCC0805X7R332K101DT
designator C?  Capacitance: 3.3nF  (hidden comment: *)
Capacitor, Ceramic (MLCC), 3.3nF, ±10%, 100V, X7R, ±10%, SMD 0805; Manufacturer: CCTC; Manufacturer Part Number: TCC0805X7R332K101DT; Package Size: 0805; JLCPCB Basic Part: No; JLCPCB Part Number: C282757; Supplier 1: LCSC; Category: Capacitors - MLCC; Supplier Part Number 1: C282757; Tolerance: ±10%; Voltage Rating: 100V; Temperature Coefficient: X7R; RoHS: Yes; ComponentLink1Description: Datasheet; ComponentLink1URL: https://wmsc.lcsc.com/wmsc/upload/file/pdf/v2/lcsc/2304140030_CCTC-TCC0805X7R332K101DT_C282757.pdf; ComponentLink2Description: JLCPCB Part URL; ComponentLink2URL: https://jlcpcb.com/partdetail/C282757; ComponentLink3Description: LCSC Part URL; ComponentLink3URL: https://lcsc.com/product-detail/Multilayer-Ceramic-Capacitors-MLCC---SMD-SMT_CCTC-CCTC-TCC0805X7R332K101DT_C282757.html
footprint CAP-0805 (0805 (2012M) Capacitor)
pins: 1, 2
